# Altium footprint library PCB封装库.PcbLib: 77 footprints (part 4 of 5)
Each footprint in its own frame and in the unit in brackets; x right, y up, seen from the top. Pads: shape width x height; smd on the part's side, far side on the other; paste and mask are expansions set on the pad; w line width, h text height; cw(c..) or ccw(c..) is an arc to the next point about the centre after c.
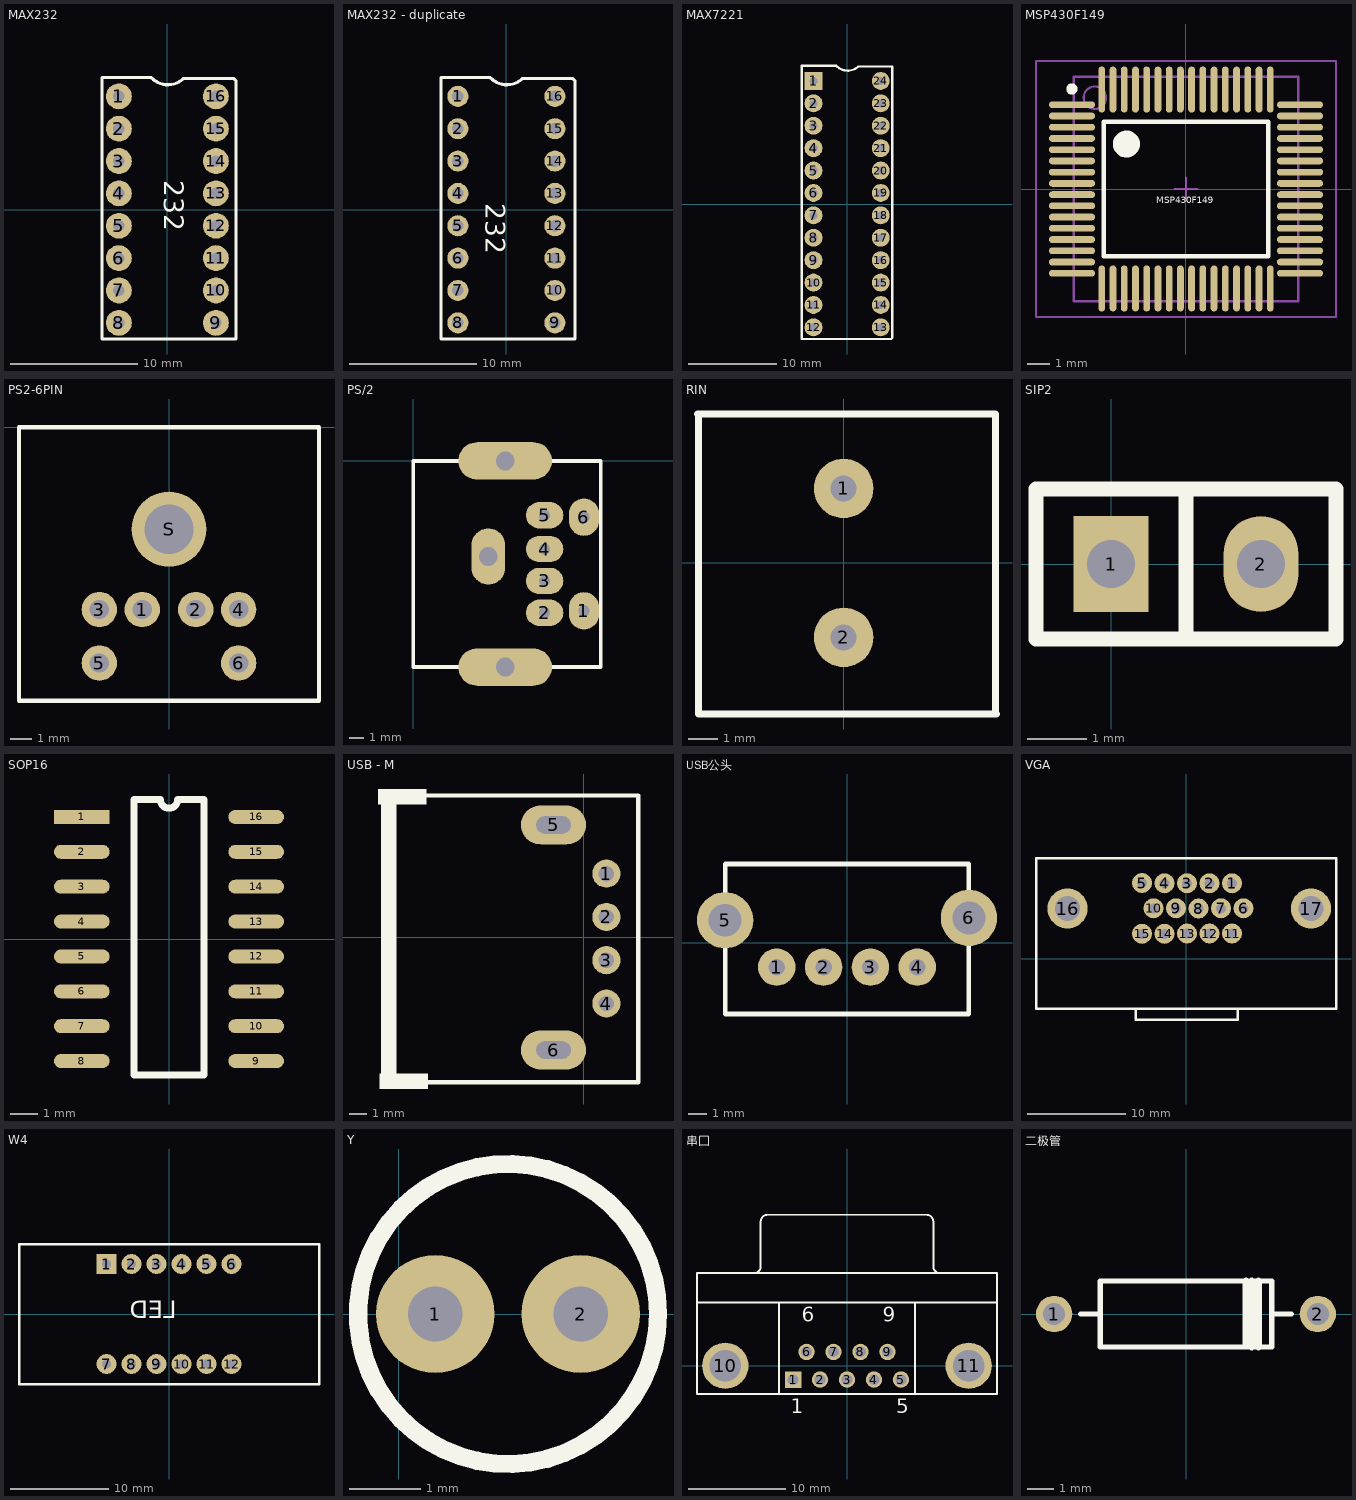
[diagram p3: the footprints below, top view; thin cyan lines are the x and y axes]

## MAX232 [mil]
pads (16):
  round 80 hole 35: 1(-150,350) 2(-150,250) 3(-150,150) 4(-150,50) 5(-150,-50) 6(-150,-150) 7(-150,-250) 8(-150,-350) 9(150,-350) 10(150,-250) 11(150,-150) 12(150,-50) 13(150,50) 14(150,150) 15(150,250) 16(150,350)
Top Overlay:
  lines w10: -202,-400 197,-400 212,-400 212,398 205,405 50,405 cw(c1.5,456.5) -50,408 -202,408 -202,-400
  text "232" at -10,90 h60

## MAX232 - duplicate [mm]
pads (16):
  round 1.652 hole 0.9: 1(-3.81,8.89) 2(-3.81,6.35) 3(-3.81,3.81) 4(-3.81,1.27) 5(-3.81,-1.27) 6(-3.81,-3.81) 7(-3.81,-6.35) 8(-3.81,-8.89) 9(3.81,-8.89) 10(3.81,-6.35) 11(3.81,-3.81) 12(3.81,-1.27) 13(3.81,1.27) 14(3.81,3.81) 15(3.81,6.35) 16(3.81,8.89)
Top Overlay:
  lines w0.254: -5.131,-10.16 5.004,-10.16 5.385,-10.16 5.385,10.109 5.207,10.287 1.27,10.287 cw(c0.038,11.595) -1.27,10.363 -5.131,10.363 -5.131,-10.16
  text "232" at -1.626,0.508 h1.52

## MAX7221 [mil]
pads (24):
  rect 80x80 hole 35: 1(-150,550)
  round 80 hole 35: 2(-150,450) 3(-150,350) 4(-150,250) 5(-150,150) 6(-150,50) 7(-150,-50) 8(-150,-150) 9(-150,-250) 10(-150,-350) 11(-150,-450) 12(-150,-550) 13(150,-550) 14(150,-450) 15(150,-350) 16(150,-250) 17(150,-150) 18(150,-50) 19(150,50) 20(150,150) 21(150,250) 22(150,350) 23(150,450) 24(150,550)
Top Overlay:
  lines w10: -203,-602 197,-602 202,-597 202,615 51,615 cw(c2.5,666.5) -49,618 -203,618 -203,-602

## MSP430F149 [mm]
pads (64):
  oval 2.05x0.3 smd: 1(-5.075,3.75) 2(-5.075,3.25) 3(-5.075,2.75) 4(-5.075,2.25) 5(-5.075,1.75) 6(-5.075,1.25) 7(-5.075,0.75) 8(-5.075,0.25) 9(-5.075,-0.25) 10(-5.075,-0.75) 11(-5.075,-1.25) 12(-5.075,-1.75) 13(-5.075,-2.25) 14(-5.075,-2.75) 15(-5.075,-3.25) 16(-5.075,-3.75) 33(5.075,-3.75) 34(5.075,-3.25) 35(5.075,-2.75) 36(5.075,-2.25) 37(5.075,-1.75) 38(5.075,-1.25) 39(5.075,-0.75) 40(5.075,-0.25) 41(5.075,0.25) 42(5.075,0.75) 43(5.075,1.25) 44(5.075,1.75) 45(5.075,2.25) 46(5.075,2.75) 47(5.075,3.25) 48(5.075,3.75)
  oval 0.3x2.05 smd: 17(-3.75,-4.425) 18(-3.25,-4.425) 19(-2.75,-4.425) 20(-2.25,-4.425) 21(-1.75,-4.425) 22(-1.25,-4.425) 23(-0.75,-4.425) 24(-0.25,-4.425) 25(0.25,-4.425) 26(0.75,-4.425) 27(1.25,-4.425) 28(1.75,-4.425) 29(2.25,-4.425) 30(2.75,-4.425) 31(3.25,-4.425) 32(3.75,-4.425) 49(3.75,4.425) 50(3.25,4.425) 51(2.75,4.425) 52(2.25,4.425) 53(1.75,4.425) 54(1.25,4.425) 55(0.75,4.425) 56(0.25,4.425) 57(-0.25,4.425) 58(-0.75,4.425) 59(-1.25,4.425) 60(-1.75,4.425) 61(-2.25,4.425) 62(-2.75,4.425) 63(-3.25,4.425) 64(-3.75,4.425)
Top Overlay:
  circle w0.6: c-2.65,2 r0.3
  circle w0.25: c-5.075,4.45 r0.125
  lines w0.2: -3.65,-3 3.65,-3 3.65,3 -3.65,3 -3.65,-3
  text "MSP430F149" at -1.321,-0.737 h0.5
Mechanical 13:
  circle w0.1: c-4.056,4.064 r0.5
  lines w0.1: -5,-5 5,-5 5,5 -5,5 -5,-5
Mechanical 15:
  lines w0.1: -0.5,0 0.5,0 ; 0,-0.5 0,0.5 ; -6.675,-5.7 6.675,-5.7 6.675,5.7 -6.675,5.7 -6.675,-5.7

## PS2-6PIN [mm] "PS2 Socket, 6 Pin, Through Hole"
pads (7):
  round 1.652 hole 0.9: 1(-1.25,-8.5) 2(1.25,-8.5) 3(-3.25,-8.5) 5(-3.25,-11) 6(3.25,-11)
  round 1.651 hole 0.9: 4(3.25,-8.5)
  round 3.5 hole 2.3: S(0,-4.75)
Top Overlay:
  lines w0.2: -7,-12.75 7,-12.75 7,0 -7,0 -7,-12.75

## PS/2 [mil]
pads (9):
  oval 80x100 hole 30: 1(455,-400) 6(455,-150)
  oval 100x70 hole 30: 2(350,-405) 3(350,-320) 4(350,-235) 5(350,-145)
  oval 90x150 hole 50: ""(200,-255)
  oval 250x100 hole 50: ""(245,-550) ""(245,0)
Top Overlay:
  lines w10: 0,-550 0,0 500,0 500,-550 0,-550

## RIN [mil]
pads (2):
  round 80 hole 35: 1(0,100) 2(0,-100)
Top Overlay:
  lines w10: -196,200 204,200 204,-203 ; -195,-203 -195,200 ; -194,-203 205,-203

## SIP2 [mil]
pads (2):
  rect 50x64 hole 32: 1(0,0)
  oval 50x64 hole 32: 2(100,0)
Top Overlay:
  lines w10: 50,-50 50,50 ; -50,-50 -50,50 150,50 150,-50 -50,-50

## SOP16 [mil]
pads (16):
  rect 80x20 smd: 1(-125,175)
  oval 80x20 smd: 2(-125,125) 3(-125,75) 4(-125,25) 5(-125,-25) 6(-125,-75) 7(-125,-125) 8(-125,-175) 9(125,-175) 10(125,-125) 11(125,-75) 12(125,-25) 13(125,25) 14(125,75) 15(125,125) 16(125,175)
Top Overlay:
  lines w10: -50,-195 50,-195 50,200 12.5,200 cw(c0,200) -12.5,200 -50,200 -50,-195

## USB - M [mil]
pads (6):
  round 65.06 hole 35.43: 1(52,147.5) 2(52,47.5) 3(52,-52.5) 4(52,-152.5)
  oval 150x90 hole 40 slot 80 at 0 deg: 5(-70,260) 6(-70,-260)
Top Overlay:
  rectangle: -468.87,-322 -432.87,328
  rectangle: -471.87,-350 -359.87,-314
  rectangle: -475.87,307 -363.87,343
  lines w10: -463.87,-334.65 -463.87,328 ; -424.5,-334.65 125.5,-334.65 ; -424.5,328 125.5,328 125.5,-322 ; 125.5,-293 125.5,-334.65 ; 125.5,-334.65 125.5,-334.65

## USB公头 [mil]
pads (6):
  round 80 hole 35 unplated: 1(-150,-52.5) 2(-50,-52.5) 3(50,-52.5) 4(150,-52.5)
  round 120 hole 70 unplated: 5(-260,47.5) 6(260,52.5)
Top Overlay:
  lines w10: -260,-152.5 260,-152.5 260,167.5 -260,167.5 -260,47.5 -260,-152.5

## VGA [mil]
pads (17):
  round 80 hole 40: 1(184,301) 2(94,301) 3(4,301) 4(-86,301) 5(-176,302) 6(230,201) 7(140,201) 8(50,200) 9(-40,201) 10(-130,201) 11(184,100) 12(94,100) 13(4,100) 14(-86,99) 15(-176,99)
  round 160 hole 100: 16(-474,200) 17(500,200)
Top Overlay:
  lines w10: -202,-200 -202,-243.76 -200.76,-245 206,-245 206,-200 ; -600,-200 600,-200 600,401 -600,401 -600,-200

## W4 [mil]
pads (12):
  rect 80x80 hole 35: 1(-250,200)
  round 80 hole 35: 2(-150,200) 3(-50,200) 4(50,200) 5(150,200) 6(250,200) 7(-250,-200) 8(-150,-200) 9(-50,-200) 10(50,-200) 11(150,-200) 12(250,-200)
Top Overlay:
  lines w10: -600,-280 600,-280 600,280 -600,280 -600,-280
  text "LED" at 30,-40 h120

## Y [mil]
height 472.44
pads (2):
  round 65 hole 30: 1(20,0) 2(100,0)
Top Overlay:
  circle w10: c60,0 r82.46

## 串囗 [mm]
pads (11):
  rect 1.69x1.69 hole 1.09: 1(-5.54,-1.42)
  round 1.69 hole 1.09: 2(-2.77,-1.42) 3(0,-1.42) 4(2.77,-1.42) 5(5.54,-1.42) 6(-4.155,1.42) 7(-1.385,1.42) 8(1.385,1.42) 9(4.155,1.42)
  round 4.76 hole 3.26: 10(-12.495,0) 11(12.495,0)
Top Overlay:
  lines w0.2: -15.4,6.5 15.4,6.5 ; -9.56,9.505 ccw(c-9.56,10.2) -8.865,10.2 -8.865,14.8 ; -8.86,14.805 cw(c-8.165,14.805) -8.165,15.5 8.165,15.5 cw(c8.165,14.805) 8.86,14.805 ; -7,-2.9 -7,6.5 ; 7,-2.9 7,6.5 ; 8.865,14.8 8.865,10.2 ccw(c9.56,10.2) 9.56,9.505 ; -15.4,-2.9 15.4,-2.9 15.4,9.5 -15.4,9.5 -15.4,-2.9
  text "6" at -4.655,4.525 h1.5
  text "9" at 3.655,4.525 h1.5
  text "5" at 5.04,-4.875 h1.5
  text "1" at -5.79,-4.875 h1.5

## 二极管 [mm]
pads (2):
  round 1.4 hole 0.85: 1(-5.08,0) 2(5.08,0)
Top Overlay:
  lines w0.2: -4.064,0 -3.302,0 ; 3.302,0 4.064,0 ; -3.302,-1.27 -3.302,1.27 3.302,1.27 3.302,-1.27 -3.302,-1.27
  lines w0.254: 2.311,-1.219 2.311,1.27 ; 2.54,-1.27 2.54,1.27 ; 2.794,-1.27 2.794,1.27